# Altium footprint library lib_datalogger.PcbLib: 866 footprints (part 26 of 55)
Each footprint in its own frame and in the unit in brackets; x right, y up, seen from the top. Pads: shape width x height; smd on the part's side, far side on the other; paste and mask are expansions set on the pad; w line width, h text height; cw(c..) or ccw(c..) is an arc to the next point about the centre after c.
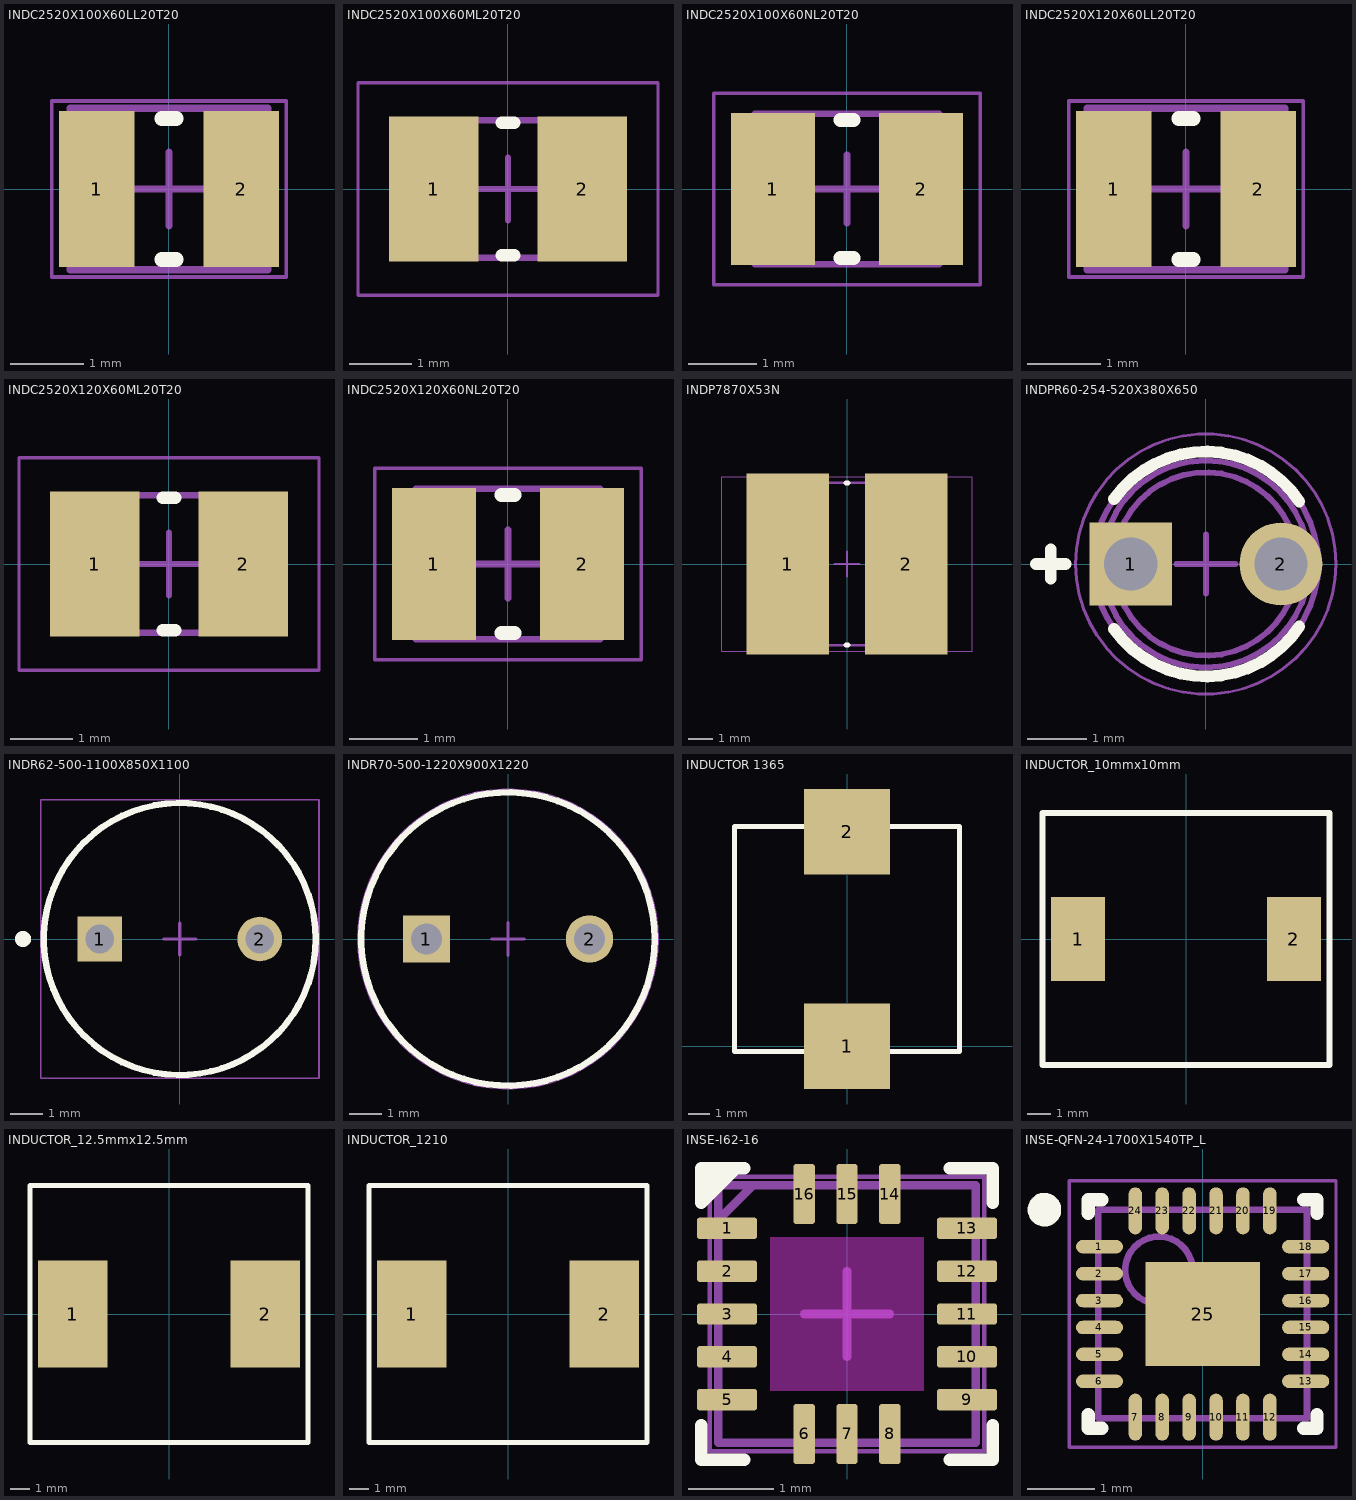
[diagram p25: the footprints below, top view; thin cyan lines are the x and y axes]

## INDC2520X100X60LL20T20 [mm] "Chip Inductor, 2-Leads, Body 2.7x2.2mm, IPC High Density"
height 1
pads (2):
  rect 1.03x2.12 smd: 1(-0.985,0) 2(0.985,0)
Top Overlay:
  lines w0.2: -0.1,-0.96 0.1,-0.96 ; -0.1,0.96 0.1,0.96
Mechanical 13:
  lines w0.1: -1.35,-1.1 -1.35,1.1 1.35,1.1 1.35,-1.1 -1.35,-1.1
Mechanical 15:
  lines w0.05: -1.6,-1.2 -1.6,1.2 1.6,1.2 1.6,-1.2 -1.6,-1.2
  lines w0.1: -0.5,0 0.5,0 ; 0,-0.5 0,0.5
3D body "INDC2520X10L.step": height 1, standoff 0, extent -1.35,-1.1 1.35,1.1

## INDC2520X100X60ML20T20 [mm] "Chip Inductor, 2-Leads, Body 2.7x2.2mm, IPC Low Density"
height 1
pads (2):
  rect 1.43x2.32 smd: 1(-1.185,0) 2(1.185,0)
Top Overlay:
  lines w0.2: -0.1,-1.06 0.1,-1.06 ; -0.1,1.06 0.1,1.06
Mechanical 13:
  lines w0.1: -1.35,-1.1 -1.35,1.1 1.35,1.1 1.35,-1.1 -1.35,-1.1
Mechanical 15:
  lines w0.05: -2.4,-1.7 -2.4,1.7 2.4,1.7 2.4,-1.7 -2.4,-1.7
  lines w0.1: -0.5,0 0.5,0 ; 0,-0.5 0,0.5
3D body "INDC2520X10M.step": height 1, standoff 0, extent -1.35,-1.1 1.35,1.1

## INDC2520X100X60NL20T20 [mm] "Chip Inductor, 2-Leads, Body 2.7x2.2mm, IPC Medium Density"
height 1
pads (2):
  rect 1.23x2.22 smd: 1(-1.085,0) 2(1.085,0)
Top Overlay:
  lines w0.2: -0.1,-1.01 0.1,-1.01 ; -0.1,1.01 0.1,1.01
Mechanical 13:
  lines w0.1: -1.35,-1.1 -1.35,1.1 1.35,1.1 1.35,-1.1 -1.35,-1.1
Mechanical 15:
  lines w0.05: -1.95,-1.4 -1.95,1.4 1.95,1.4 1.95,-1.4 -1.95,-1.4
  lines w0.1: -0.5,0 0.5,0 ; 0,-0.5 0,0.5
3D body "INDC2520X10N.step": height 1, standoff 0, extent -1.35,-1.1 1.35,1.1

## INDC2520X120X60LL20T20 [mm] "Chip Inductor, 2-Leads, Body 2.70x2.20mm, IPC High Density"
height 1.2
pads (2):
  rect 1.03x2.12 smd: 1(-0.985,0) 2(0.985,0)
Top Overlay:
  lines w0.2: -0.1,-0.96 0.1,-0.96 ; -0.1,0.96 0.1,0.96
Mechanical 13:
  lines w0.1: -1.35,-1.1 1.35,-1.1 1.35,1.1 -1.35,1.1 -1.35,-1.1
Mechanical 15:
  lines w0.05: -1.6,-1.2 1.6,-1.2 1.6,1.2 -1.6,1.2 -1.6,-1.2
  lines w0.1: -0.5,0 0.5,0 ; 0,-0.5 0,0.5
3D body "INDC2520X12L.step": height 1.2, standoff 0, extent -1.35,-1.1 1.35,1.1

## INDC2520X120X60ML20T20 [mm] "Chip Inductor, 2-Leads, Body 2.70x2.20mm, IPC Low Density"
height 1.2
pads (2):
  rect 1.43x2.32 smd: 1(-1.185,0) 2(1.185,0)
Top Overlay:
  lines w0.2: -0.1,-1.06 0.1,-1.06 ; -0.1,1.06 0.1,1.06
Mechanical 13:
  lines w0.1: -1.35,-1.1 1.35,-1.1 1.35,1.1 -1.35,1.1 -1.35,-1.1
Mechanical 15:
  lines w0.05: -2.4,-1.7 2.4,-1.7 2.4,1.7 -2.4,1.7 -2.4,-1.7
  lines w0.1: -0.5,0 0.5,0 ; 0,-0.5 0,0.5
3D body "INDC2520X12M.step": height 1.2, standoff 0, extent -1.35,-1.1 1.35,1.1

## INDC2520X120X60NL20T20 [mm] "Chip Inductor, 2-Leads, Body 2.70x2.20mm, IPC Medium Density"
height 1.2
pads (2):
  rect 1.23x2.22 smd: 1(-1.085,0) 2(1.085,0)
Top Overlay:
  lines w0.2: -0.1,-1.01 0.1,-1.01 ; -0.1,1.01 0.1,1.01
Mechanical 13:
  lines w0.1: -1.35,-1.1 -1.35,1.1 1.35,1.1 1.35,-1.1 -1.35,-1.1
Mechanical 15:
  lines w0.05: -1.95,-1.4 -1.95,1.4 1.95,1.4 1.95,-1.4 -1.95,-1.4
  lines w0.1: -0.5,0 0.5,0 ; 0,-0.5 0,0.5
3D body "INDC2520X12N.step": height 1.2, standoff 0, extent -1.35,-1.1 1.35,1.1

## INDP7870X53N [mm] "Precision Wire Wound Inductor, 2-Leads, Body 7,80x7,00mm, IPC Medium Density"
height 5.3
pads (2):
  rect 3.4x7.5 smd: 1(-2.45,0) 2(2.45,0)
Top Overlay:
  lines w0.2: -0.05,-3.35 0.05,-3.35 ; -0.05,3.35 0.05,3.35
Mechanical 13:
  lines w0.1: -3.75,-3.35 -3.75,3.35 3.75,3.35 3.75,-3.35 -3.75,-3.35
Mechanical 15:
  lines w0.05: -5.175,-3.6 -5.175,3.6 5.175,3.6 5.175,-3.6 -5.175,-3.6
  lines w0.1: -0.5,0 0.5,0 ; 0,-0.5 0,0.5
3D body "INDP7870X53N.step": height 5.4, standoff 0, extent -4,-3.75 4,3.75

## INDPR60-254-520X380X650 [mm] "THD, 2-Leads, Dia 3.8mm, Pitch 2.54mm"
height 6.5
pads (2):
  rect 1.4x1.4 hole 0.9: 1(-1.27,0)
  round 1.4 hole 0.9: 2(1.27,0)
Top Overlay:
  lines w0.2: -2.87,0 -2.37,0 ; -2.62,-0.25 -2.62,0.25 ; -1.549,-1.1 ccw(c0,0) 1.58,-1.056 ; -1.549,1.1 cw(c0,0) 1.58,1.056
Mechanical 13:
  circle w0.1: c0,0 r1.9
  circle w0.1: c0,0 r1.55
  circle w0.1: c0,0 r1.75
Mechanical 15:
  circle w0.05: c0,0 r2.2
  lines w0.1: -0.5,0 0.5,0 ; 0,-0.5 0,0.5
3D body: height 1, standoff -24, extent -1.495,-0.2 -1.045,0.2
3D body: height 1, standoff -23, extent 1.045,-0.2 1.495,0.2
3D body: height 6.5, standoff 3.4, extent -1.548,-1.55 1.55,1.55
3D body: height 1.7, standoff 1, extent -1.899,-1.899 1.899,1.899
3D body: height 4.95, standoff 1, extent -1.549,-1.549 1.549,1.549
3D body: height 2.1, standoff 1, extent -1.75,-1.75 1.749,1.749

## INDR62-500-1100X850X1100 [mm] "THD, 2-Leads, Dia 8.5mm, Pitch 5mm"
height 11
pads (2):
  rect 1.4x1.4 hole 0.9: 1(-2.5,0)
  round 1.4 hole 0.9: 2(2.5,0)
Top Overlay:
  circle w0.25: c-4.9,0 r0.125
  circle w0.2: c0,0 r4.25
Mechanical 13:
  circle w0.1: c0,0 r4.25
Mechanical 15:
  lines w0.05: -4.35,-4.35 4.35,-4.35 4.35,4.35 -4.35,4.35 -4.35,-4.35
  lines w0.1: -0.5,0 0.5,0 ; 0,-0.5 0,0.5
3D body "rl622.stp": height 11, standoff -5, extent -4.25,-4.25 4.25,4.25

## INDR70-500-1220X900X1220 [mm] "THD, 2-Leads, Dia 9mm"
height 12.2
pads (2):
  rect 1.45x1.45 hole 0.95: 1(-2.5,0)
  round 1.45 hole 0.95: 2(2.5,0)
Top Overlay:
  circle w0.2: c0,0 r4.5
Mechanical 13:
  circle w0.1: c0,0 r4.5
  circle w0.1: c0,0 r4.5
Mechanical 15:
  circle w0.05: c0,0 r4.6
  lines w0.1: -0.5,0 0.5,0 ; 0,-0.5 0,0.5
3D body: height 12.2, standoff 0, extent -4.499,-4.499 4.499,4.499
3D body: height 0, standoff -25, extent -2.825,-0.325 -2.175,0.325
3D body: height 0, standoff -18, extent 2.175,-0.325 2.825,0.325

## INDUCTOR 1365 [mm]
pads (2):
  rect 4x4 smd: 1(0,0) 2(0,10)
Top Overlay:
  lines w0.254: -5.25,-0.25 -5.25,10.25 5.25,10.25 5.25,-0.25 -5.25,-0.25
3D body "User Library-744325120.STEP": height 4.72, standoff -0.09, extent -5.262,-0.5 5.25,10.5

## INDUCTOR_10mmx10mm [mm]
pads (2):
  rect 2.3x3.6 smd: 1(-4.6,0) 2(4.6,0)
Top Overlay:
  lines w0.254: -6.121,-5.385 -6.121,5.385 6.121,5.385 6.121,-5.385 -6.121,-5.385
3D body "indutor.stp": height 9.3, standoff 0, extent -5.125,-5 5.125,5

## INDUCTOR_12.5mmx12.5mm [mm]
height 6
pads (2):
  rect 3.5x5.4 smd: 1(-4.85,0) 2(4.85,0)
Top Overlay:
  lines w0.254: -7,-6.477 7,-6.477 7,6.477 -7,6.477 -7,-6.477
3D body "SRR1280 Series.step": height 7.51, standoff 0, extent -6.25,-6.25 6.25,6.25

## INDUCTOR_1210 [mm]
pads (2):
  rect 3.5x5.4 smd: 1(-4.85,0) 2(4.85,0)
Top Overlay:
  lines w0.254: -7,-6.477 -7,6.477 7,6.477 7,-6.477 -7,-6.477
3D body "SRR1280 Series.step": height 7.51, standoff 0, extent -6.25,-6.25 6.25,6.25

## INSE-I62-16 [mm] "LGA, 16-Leads, Body 3x3mm, Pitch 0.5mm"
height 0.8
pads (16):
  rrect25% 0.7x0.25 smd: 1(-1.4,1) 2(-1.4,0.5) 3(-1.4,0) 4(-1.4,-0.5) 5(-1.4,-1) 9(1.4,-1) 10(1.4,-0.5) 11(1.4,0) 12(1.4,0.5) 13(1.4,1)
  rrect25% 0.25x0.7 smd: 6(-0.5,-1.4) 7(0,-1.4) 8(0.5,-1.4) 14(0.5,1.4) 15(0,1.4) 16(-0.5,1.4)
Top Layer keep-out:
  rectangle: -0.9,-0.9 0.9,0.9
Top Overlay:
  region: -1.7,1.7 -1.7,1.3 -1.3,1.7
  lines w0.15: -1.7,-1.3 -1.7,-1.7 -1.2,-1.7 ; -1.3,1.7 -1.7,1.3 -1.7,1.7 -1.2,1.7 ; 1.2,-1.7 1.7,-1.7 1.7,-1.3 ; 1.2,1.7 1.7,1.7 1.7,1.3
Mechanical 13:
  lines w0.1: -1.5,1.1 -1.1,1.5 ; -1.5,-1.5 1.5,-1.5 1.5,1.5 -1.5,1.5 -1.5,-1.5
Mechanical 15:
  lines w0.05: -1.6,-1.6 1.6,-1.6 1.6,1.6 -1.6,1.6 -1.6,-1.6
  lines w0.1: -0.5,0 0.5,0 ; 0,-0.5 0,0.5
Top Designator:
  text ".Designator" at -1.27,-0.127 h0.6
3D body "LGA-16_3x3x0.75.STEP": height 0.75, standoff -0.01, extent -1.5,-1.5 1.5,1.5

## INSE-QFN-24-1700X1540TP_L [mm] "QFN, 24-Leads, Body 3.1x3.1mm, Pitch 0.40mm, Thermal Pad 1.54x1.70mm, IPC High Density"
height 1.05
pads (25):
  oval 0.7x0.2 smd: 1(-1.532,1) 2(-1.532,0.6) 3(-1.532,0.2) 4(-1.532,-0.2) 5(-1.532,-0.6) 6(-1.532,-1) 13(1.532,-1) 14(1.532,-0.6) 15(1.532,-0.2) 16(1.532,0.2) 17(1.532,0.6) 18(1.532,1)
  oval 0.2x0.7 smd: 7(-1,-1.532) 8(-0.6,-1.532) 9(-0.2,-1.532) 10(0.2,-1.532) 11(0.6,-1.532) 12(1,-1.532) 19(1,1.532) 20(0.6,1.532) 21(0.2,1.532) 22(-0.2,1.532) 23(-0.6,1.532) 24(-1,1.532)
  rect 1.7x1.54 smd: 25(0,0)
Top Overlay:
  circle w0.25: c-2.35,1.55 r0.125
  lines w0.2: -1.7,-1.5 -1.7,-1.7 -1.5,-1.7 ; -1.7,1.5 -1.7,1.7 -1.5,1.7 ; 1.5,-1.7 1.7,-1.7 1.7,-1.5 ; 1.5,1.7 1.7,1.7 1.7,1.5
Mechanical 13:
  circle w0.1: c-0.65,0.65 r0.5
  lines w0.1: -1.55,-1.55 -1.55,1.55 1.55,1.55 1.55,-1.55 -1.55,-1.55
Mechanical 15:
  lines w0.05: -1.982,-1.982 -1.982,1.982 1.982,1.982 1.982,-1.982 -1.982,-1.982
  lines w0.1: -0.5,0 0.5,0 ; 0,-0.5 0,0.5
3D body "QFN40P300X300X105_HS-25L.step": height 1.05, standoff 0, extent -1.551,-1.551 1.551,1.551